# Altium schematic symbol library MYLIB.SchLib: 366 symbols (part 1 of 52)
Pins are listed as number, name and electrical type; pins without a type are passive.

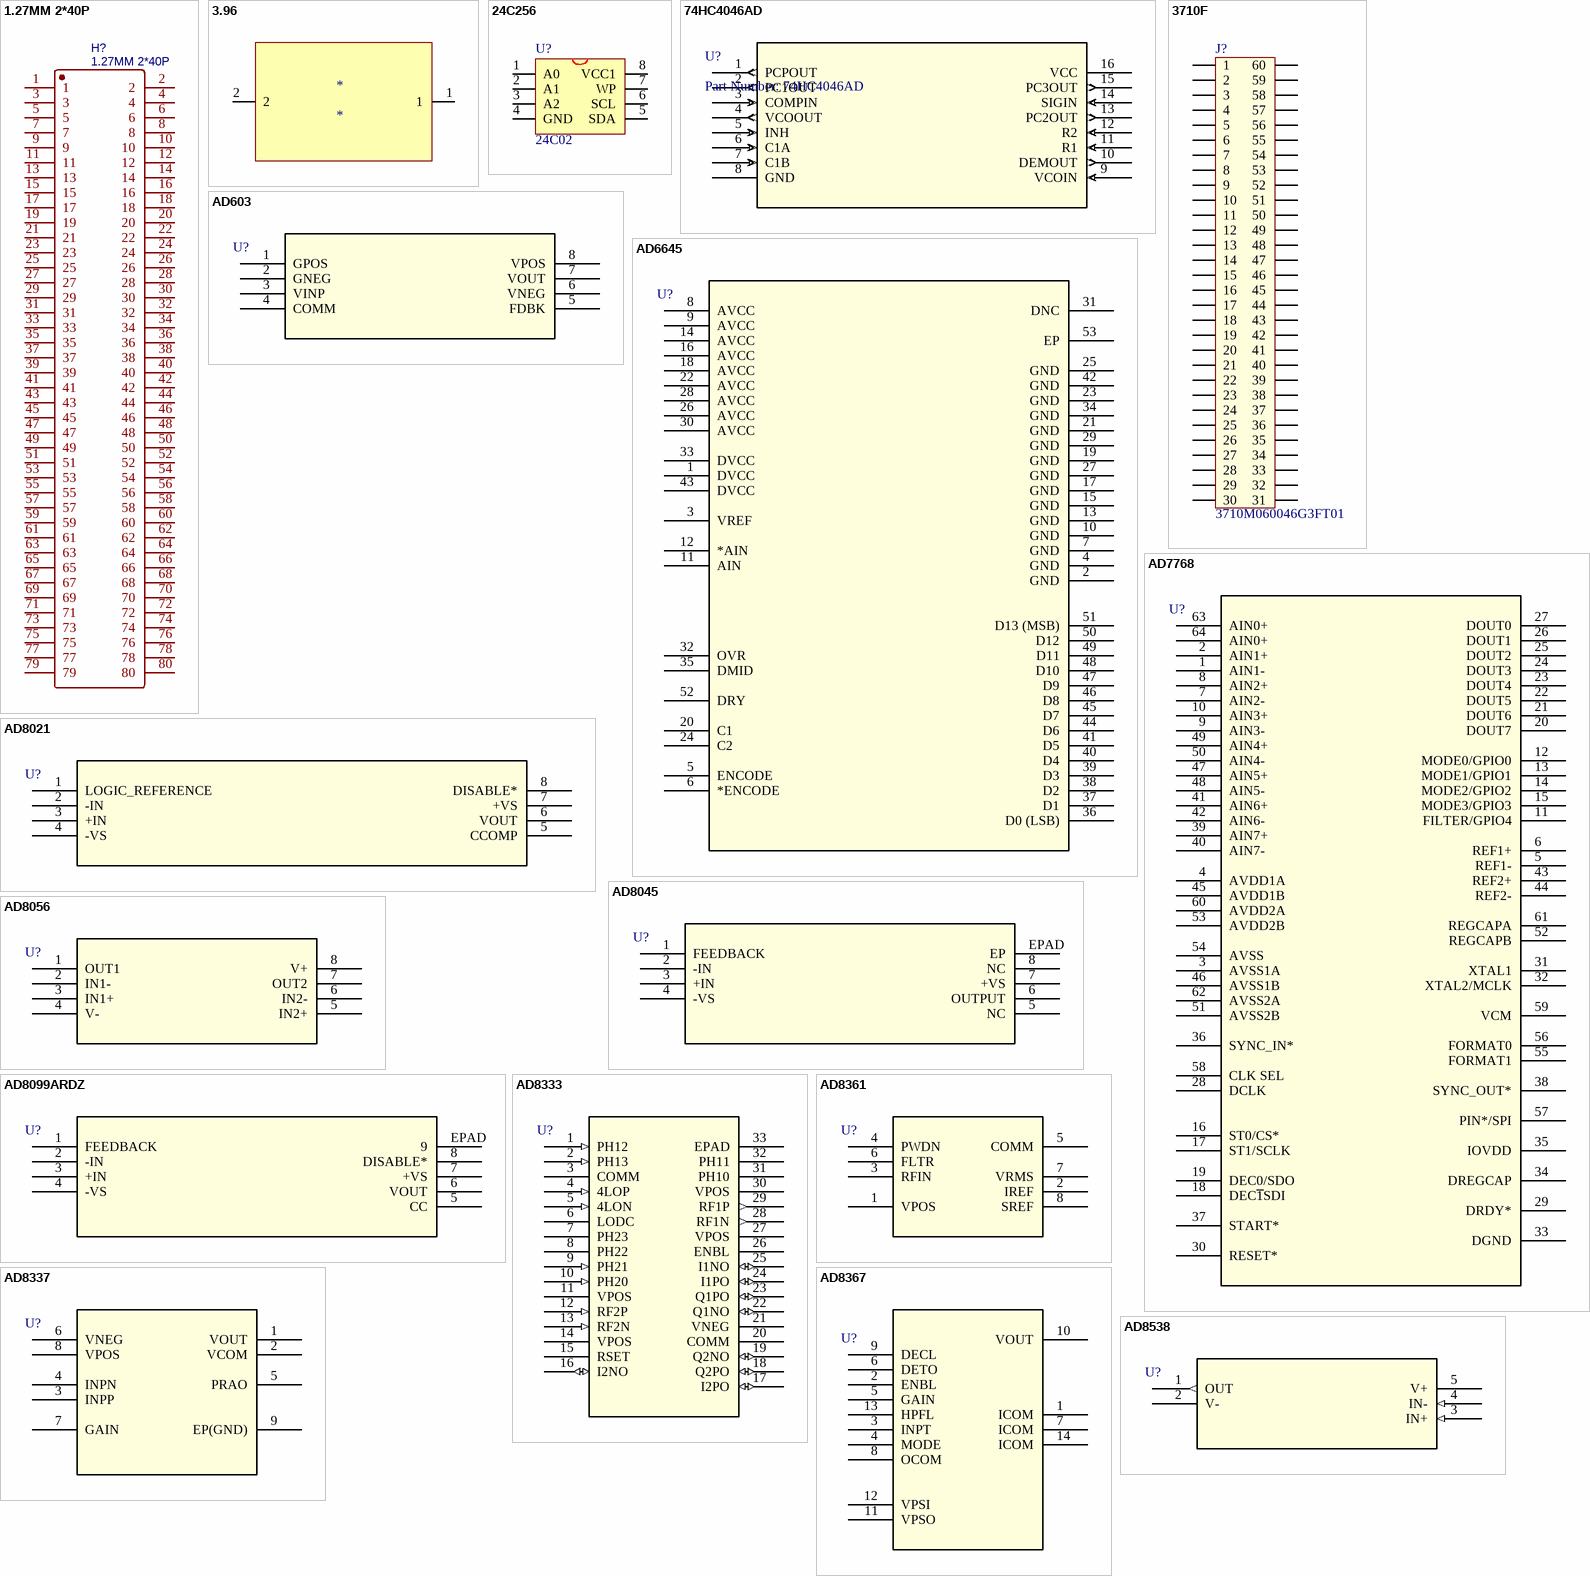
[diagram p0: symbols 1.27MM 2*40P to AD8538]

## 1.27MM 2*40P
designator H?
BOM_Manufacturer: BOOMELE; Contributor: LCSC; BOM_Supplier: LCSC; BOM_Manufacturer Part: 1.27mm 2*40P; BOM_Supplier Part: C34334; spicePre: H
footprint SMD-2X40P-1.27MM
pins: 1, 2, 3, 4, 5, 6, 7, 8, 9, 10, 11, 12, 13, 14, 15, 16, 17, 18, 19, 20, 21, 22, 23, 24, 25, 26, 27, 28, 29, 30, 31, 32, 33, 34, 35, 36, 37, 38, 39, 40, 41, 42, 43, 44, 45, 46, 47, 48, 49, 50, 51, 52, 53, 54, 55, 56, 57, 58, 59, 60, 61, 62, 63, 64, 65, 66, 67, 68, 69, 70, 71, 72, 73, 74, 75, 76, 77, 78, 79, 80

## 3.96
designator *
footprint 3.96
pins: 1, 2

## 24C256
designator U?, comment 24C02
EEPROM
footprint SOP-8 (SSOP8)
footprint TSSOP8 (Shrink Small Outline, MSOP; 8 Leads; Body Width 3 mm; Pitch 0.65 mm)
pins: 1 A0, 2 A1, 3 A2, 4 GND, 5 SDA, 6 SCL, 7 WP, 8 VCC1

## 74HC4046AD
designator U?, comment Part Number: 74HC4046AD
锁相环; Vendor: Nexperia; Manufacturer_Part_Number: 74HC4046AD; Copyright: Copyright (C) 2016 Accelerated Designs. All rights reserved; RefDes: RefDes; Type: DEV; Value: Value
footprint SOT109-1
footprint SOT109-1-M
footprint SOT109-1-L
pins: 1 PCPOUT (out), 2 PC1OUT (out), 3 COMPIN (in), 4 VCOOUT (out), 5 INH (in), 6 C1A (in), 7 C1B (in), 8 GND (power), 9 VCOIN (in), 10 DEMOUT (out), 11 R1 (in), 12 R2 (in), 13 PC2OUT (out), 14 SIGIN (in), 15 PC3OUT (out), 16 VCC (power)

## 3710F
designator J?, comment 3710M060046G3FT01
3710F060046G3FT01
footprint 3710F060046G3FT01 (PIN:0.8mm;SOP;FEMALE)
pins: 1, 2, 3, 4, 5, 6, 7, 8, 9, 10, 11, 12, 13, 14, 15, 16, 17, 18, 19, 20, 21, 22, 23, 24, 25, 26, 27, 28, 29, 30, 31, 32, 33, 34, 35, 36, 37, 38, 39, 40, 41, 42, 43, 44, 45, 46, 47, 48, 49, 50, 51, 52, 53, 54, 55, 56, 57, 58, 59, 60

## AD603
designator U?
低噪声、90 MHz可变增益放大器; Manufacturer_Part_Number: AD603ARZ; Vendor: Analog Devices Inc; Built_By: EMA_UL_Team; Copyright: Copyright (C) 2018 Accelerated Designs. All rights reserved; RefDes: RefDes; Type: DEV; Value: Value
footprint R_8
footprint R_8-L
footprint R_8-M
pins: 1 GPOS, 2 GNEG, 3 VINP, 4 COMM, 5 FDBK, 6 VNEG (power), 7 VOUT, 8 VPOS (power)

## AD6645
designator U?
14位、80 MSPS / 105 MSPS模数转换器; Copyright: Copyright (C) 2018 Accelerated Designs. All rights reserved; RefDes: RefDes; Type: DEV; Value: Value
footprint SV_52_1
pins: 1 DVCC, 2 GND, 3 VREF, 4 GND, 5 ENCODE, 6 *ENCODE, 7 GND, 8 AVCC, 9 AVCC, 10 GND, 11 AIN, 12 *AIN, 13 GND, 14 AVCC, 15 GND, 16 AVCC, 17 GND, 18 AVCC, 19 GND, 20 C1, 21 GND, 22 AVCC, 23 GND, 24 C2, 25 GND, 26 AVCC, 27 GND, 28 AVCC, 29 GND, 30 AVCC, 31 DNC, 32 OVR, 33 DVCC, 34 GND, 35 DMID, 36 D0 (LSB), 37 D1, 38 D2, 39 D3, 40 D4, 41 D5, 42 GND, 43 DVCC, 44 D6, 45 D7, 46 D8, 47 D9, 48 D10, 49 D11, 50 D12, 51 D13 (MSB), 52 DRY, 53 EP

## AD7768
designator U?
8通道、24位同步采样ADC; Manufacturer_Part_Number: AD7768BSTZ; Vendor: Analog Devices Inc; Built_By: EMA_UL_Team; Copyright: Copyright (C) 2018 Accelerated Designs. All rights reserved; RefDes: RefDes; Type: DEV; Value: Value
footprint ST_64_2
pins: 1 AIN1-, 2 AIN1+, 3 AVSS1A, 4 AVDD1A, 5 REF1-, 6 REF1+, 7 AIN2-, 8 AIN2+, 9 AIN3-, 10 AIN3+, 11 FILTER/GPIO4, 12 MODE0/GPIO0, 13 MODE1/GPIO1, 14 MODE2/GPIO2, 15 MODE3/GPIO3, 16 ST0/CS*, 17 ST1/SCLK, 18 DEC~{1}SDI, 19 DEC0/SDO, 20 DOUT7, 21 DOUT6, 22 DOUT5, 23 DOUT4, 24 DOUT3, 25 DOUT2, 26 DOUT1, 27 DOUT0, 28 DCLK, 29 DRDY*, 30 RESET*, 31 XTAL1, 32 XTAL2/MCLK, 33 DGND, 34 DREGCAP, 35 IOVDD, 36 SYNC_IN*, 37 START*, 38 SYNC_OUT*, 39 AIN7+, 40 AIN7-, 41 AIN6+, 42 AIN6-, 43 REF2+, 44 REF2-, 45 AVDD1B, 46 AVSS1B, 47 AIN5+, 48 AIN5-, 49 AIN4+, 50 AIN4-, 51 AVSS2B, 52 REGCAPB, 53 AVDD2B, 54 AVSS, 55 FORMAT1, 56 FORMAT0, 57 PIN*/SPI, 58 CLK SEL, 59 VCM, 60 AVDD2A, 61 REGCAPA, 62 AVSS2A, 63 AIN0+, 64 AIN0+

## AD8021
designator U?
低噪声、高速放大器，用于16 Bit系统; Manufacturer_Part_Number: AD8021ARZ; Vendor: Analog Devices Inc; Built_By: EMA_UL_Team; Copyright: Copyright (C) 2018 Accelerated Designs. All rights reserved; RefDes: RefDes; Type: DEV; Value: Value
footprint R_8
footprint R_8-L
footprint R_8-M
pins: 1 LOGIC_REFERENCE, 2 -IN, 3 +IN, 4 -VS (power), 5 CCOMP, 6 VOUT, 7 +VS (power), 8 DISABLE*

## AD8045
designator U?
3 nV/√Hz超低失真、电压反馈型、高速放大器; Manufacturer_Part_Number: AD8045ARDZ-REEL7; Vendor: Analog Devices Inc; Built_By: EMA_UL_Team; Copyright: Copyright (C) 2018 Accelerated Designs. All rights reserved; RefDes: RefDes; Type: DEV; Value: Value
footprint RD_8_1
footprint RD_8_1-L
footprint RD_8_1-M
pins: 1 FEEDBACK, 2 -IN, 3 +IN, 4 -VS (power), 5 NC, 6 OUTPUT, 7 +VS (power), 8 NC, EPAD EP

## AD8056
designator U?
双路、低成本、300 MHz电压反馈型放大器; Manufacturer_Part_Number: AD8671ARZ; Vendor: Analog Devices Inc; Built_By: EMA_UL_Team; Copyright: Copyright (C) 2018 Accelerated Designs. All rights reserved; RefDes: RefDes; Type: DEV; Value: Value
footprint R_8
footprint R_8-L
footprint R_8-M
pins: 1 OUT1, 2 IN1-, 3 IN1+, 4 V- (power), 5 IN2+, 6 IN2-, 7 OUT2 (power), 8 V+

## AD8099ARDZ
designator U?
超低失真、高速、0.95NV/√HZ电压噪声运算放大器; Manufacturer_Part_Number: AD8099ARDZ; Vendor: Analog Devices Inc; Built_By: EMA_UL_Team; Copyright: Copyright (C) 2018 Accelerated Designs. All rights reserved; RefDes: RefDes; Type: DEV; Value: Value
footprint RD_8_1
footprint RD_8_1-L
footprint RD_8_1-M
pins: 1 FEEDBACK, 2 -IN, 3 +IN, 4 -VS (power), 5 CC, 6 VOUT, 7 +VS (power), 8 DISABLE*, EPAD 9

## AD8333
designator U?
DC至50 MHz、双通道I/Q解调器和移相器; Manufacturer_Part_Number: AD8333ACPZ-WP; Vendor: Analog Devices Inc; Built_By: EMA_Jessica; Copyright: Copyright (C) 2018 Accelerated Designs. All rights reserved; RefDes: RefDes; Type: DEV; Value: Value
footprint CP_32_7
footprint CP_32_7-L
footprint CP_32_7-M
pins: 1 PH12 (in), 2 PH13 (in), 3 COMM, 4 4LOP (in), 5 4LON (in), 6 LODC, 7 PH23, 8 PH22, 9 PH21 (in), 10 PH20 (in), 11 VPOS (power), 12 RF2P (in), 13 RF2N (in), 14 VPOS (power), 15 RSET, 16 I2NO (io), 17 I2PO (io), 18 Q2PO (io), 19 Q2NO (io), 20 COMM, 21 VNEG (power), 22 Q1NO (io), 23 Q1PO (io), 24 I1PO (io), 25 I1NO (io), 26 ENBL, 27 VPOS (power), 28 RF1N (out), 29 RF1P (out), 30 VPOS (power), 31 PH10, 32 PH11, 33 EPAD

## AD8337
designator U?
通用型低成本直流耦合VGA; Copyright: Copyright (C) 2018 Accelerated Designs. All rights reserved; RefDes: RefDes; Type: DEV; Value: Value
footprint CP_8_13
pins: 1 VOUT, 2 VCOM, 3 INPP, 4 INPN, 5 PRAO, 6 VNEG, 7 GAIN, 8 VPOS, 9 EP(GND)

## AD8361
designator U?
LF至2.5 GHz TruPwr™检波器; Manufacturer_Part_Number: AD8361ARMZ; Vendor: Analog Devices Inc; Built_By: Analog_Devices_Team; Copyright: Copyright (C) 2018 Accelerated Designs. All rights reserved; RefDes: RefDes; Type: DEV; Value: Value
footprint RM_8
pins: 1 VPOS (power), 2 IREF (power), 3 RFIN, 4 PWDN, 5 COMM, 6 FLTR, 7 VRMS, 8 SREF

## AD8367
designator U?
500 MHz 、45dB线性dB可变增益放大器; Manufacturer_Part_Number: AD8367ARUZ; Built_By: EMA_UL_Team; Vendor: Analog Devices Inc; Copyright: Copyright (C) 2018 Accelerated Designs. All rights reserved; RefDes: RefDes; Type: DEV; Value: Value
footprint RU_14
pins: 1 ICOM, 2 ENBL, 3 INPT, 4 MODE, 5 GAIN, 6 DETO, 7 ICOM, 8 OCOM, 9 DECL, 10 VOUT, 11 VPSO (power), 12 VPSI (power), 13 HPFL, 14 ICOM

## AD8538
designator U?
低功耗、精密、自稳零运算放大器（采用5引脚TSOT-23封装）; Manufacturer_Part_Number: AD8538AUJZ-REEL7; Vendor: Analog Devices Inc; Built_By: EMA_UL_Team; Copyright: Copyright (C) 2018 Accelerated Designs. All rights reserved; RefDes: RefDes; Type: DEV; Value: Value
footprint UJ_5
pins: 1 OUT (out), 2 V- (power), 3 IN+ (in), 4 IN- (in), 5 V+ (power)

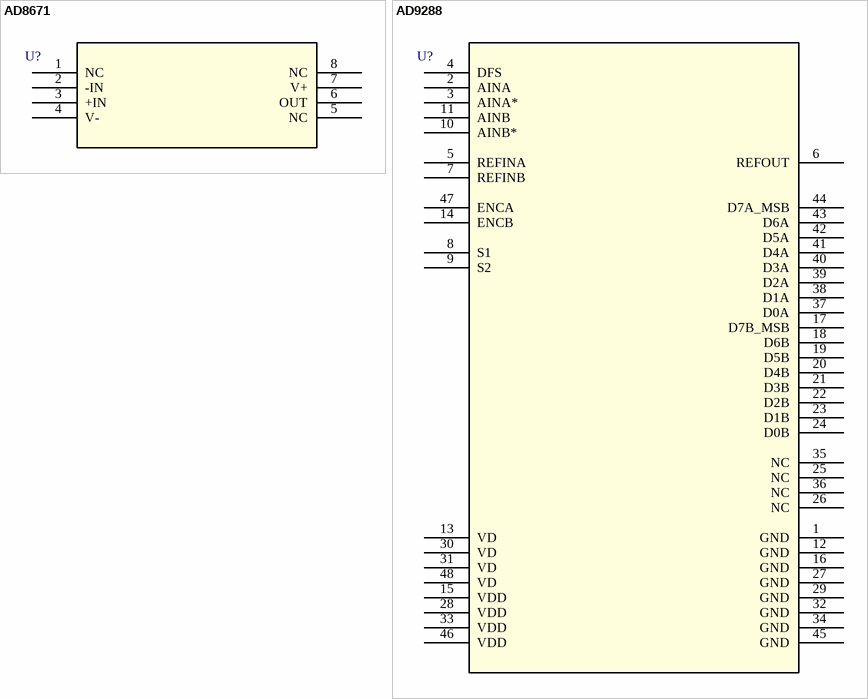
[diagram p1: symbols AD8671 to AD9288]

## AD8671
designator U?
精密、低噪声、低输入偏置电流、单通道运算放大器; Manufacturer_Part_Number: AD8671ARZ; Vendor: Analog Devices Inc; Built_By: EMA_UL_Team; Copyright: Copyright (C) 2018 Accelerated Designs. All rights reserved; RefDes: RefDes; Type: DEV; Value: Value
footprint R_8
footprint R_8-L
footprint R_8-M
pins: 1 NC, 2 -IN, 3 +IN, 4 V- (power), 5 NC, 6 OUT, 7 V+ (power), 8 NC

## AD9288
designator U?
8位、40/80/100 MSPS、双核ADC; Manufacturer_Part_Number: AD9288BSTZ-100; Vendor: Vendor; Copyright: Copyright (C) 2018 Accelerated Designs. All rights reserved; RefDes: RefDes; Type: DEV; Value: Value
footprint ST_48
pins: 1 GND, 2 AINA, 3 AINA*, 4 DFS, 5 REFINA, 6 REFOUT, 7 REFINB, 8 S1, 9 S2, 10 AINB*, 11 AINB, 12 GND, 13 VD (power), 14 ENCB, 15 VDD (power), 16 GND, 17 D7B_MSB, 18 D6B, 19 D5B, 20 D4B, 21 D3B, 22 D2B, 23 D1B, 24 D0B, 25 NC, 26 NC, 27 GND, 28 VDD (power), 29 GND, 30 VD (power), 31 VD (power), 32 GND, 33 VDD (power), 34 GND, 35 NC, 36 NC, 37 D0A, 38 D1A, 39 D2A, 40 D3A, 41 D4A, 42 D5A, 43 D6A, 44 D7A_MSB, 45 GND, 46 VDD (power), 47 ENCA, 48 VD (power)

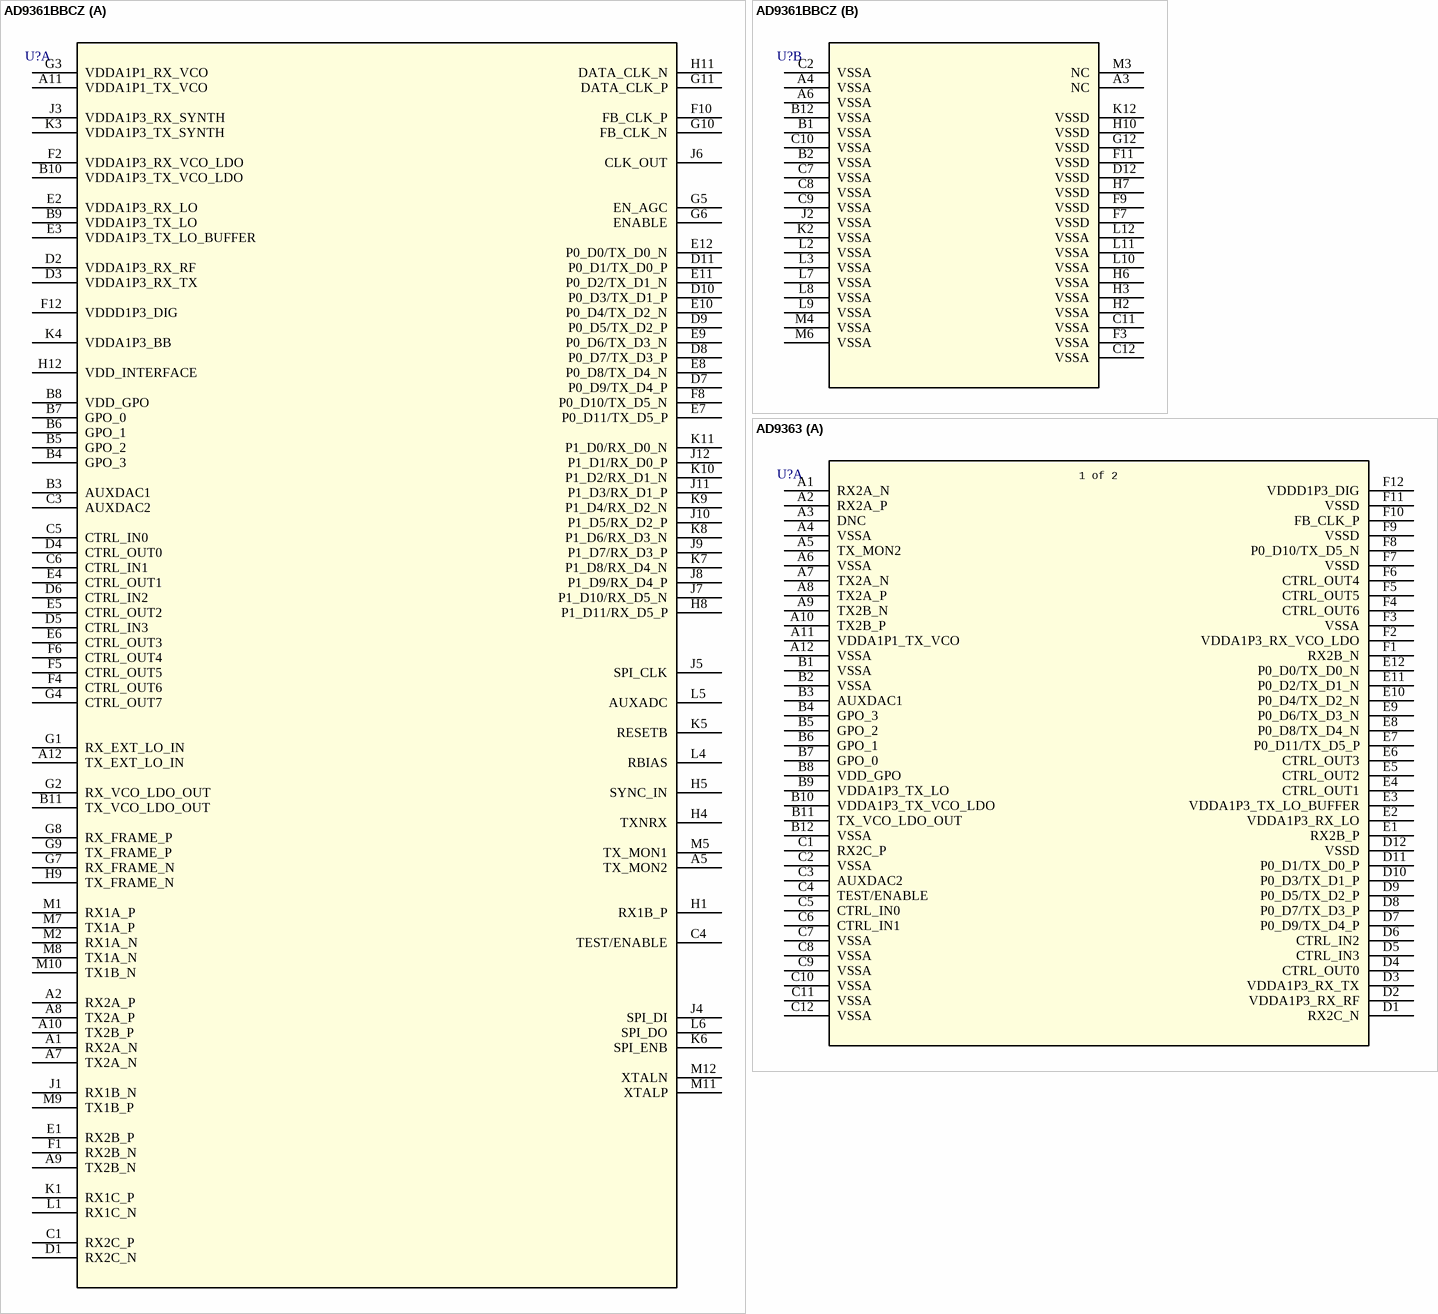
[diagram p2: symbols AD9361BBCZ to AD9363]

## AD9361BBCZ
designator U?
2 X 2 RF捷变收发器; Manufacturer_Part_Number: AD9361BBCZ; Vendor: Analog Devices Inc; Built_By: EMA_UL_Team; Copyright: Copyright (C) 2018 Accelerated Designs. All rights reserved; RefDes: RefDes; Type: DEV; Value: Value
footprint BC_144_7
part A pins: A1 RX2A_N, A2 RX2A_P, A5 TX_MON2, A7 TX2A_N, A8 TX2A_P, A9 TX2B_N, A10 TX2B_P, A11 VDDA1P1_TX_VCO, A12 TX_EXT_LO_IN, B3 AUXDAC1, B4 GPO_3, B5 GPO_2, B6 GPO_1, B7 GPO_0, B8 VDD_GPO, B9 VDDA1P3_TX_LO, B10 VDDA1P3_TX_VCO_LDO, B11 TX_VCO_LDO_OUT, C1 RX2C_P, C3 AUXDAC2, C4 TEST/ENABLE, C5 CTRL_IN0, C6 CTRL_IN1, D1 RX2C_N, D2 VDDA1P3_RX_RF, D3 VDDA1P3_RX_TX, D4 CTRL_OUT0, D5 CTRL_IN3, D6 CTRL_IN2, D7 P0_D9/TX_D4_P, D8 P0_D7/TX_D3_P, D9 P0_D5/TX_D2_P, D10 P0_D3/TX_D1_P, D11 P0_D1/TX_D0_P, E1 RX2B_P, E2 VDDA1P3_RX_LO, E3 VDDA1P3_TX_LO_BUFFER, E4 CTRL_OUT1, E5 CTRL_OUT2, E6 CTRL_OUT3, E7 P0_D11/TX_D5_P, E8 P0_D8/TX_D4_N, E9 P0_D6/TX_D3_N, E10 P0_D4/TX_D2_N, E11 P0_D2/TX_D1_N, E12 P0_D0/TX_D0_N, F1 RX2B_N, F2 VDDA1P3_RX_VCO_LDO, F4 CTRL_OUT6, F5 CTRL_OUT5, F6 CTRL_OUT4, F8 P0_D10/TX_D5_N, F10 FB_CLK_P, F12 VDDD1P3_DIG, G1 RX_EXT_LO_IN, G2 RX_VCO_LDO_OUT, G3 VDDA1P1_RX_VCO, G4 CTRL_OUT7, G5 EN_AGC, G6 ENABLE, G7 RX_FRAME_N, G8 RX_FRAME_P, G9 TX_FRAME_P, G10 FB_CLK_N, G11 DATA_CLK_P, H1 RX1B_P, H4 TXNRX, H5 SYNC_IN, H8 P1_D11/RX_D5_P, H9 TX_FRAME_N, H11 DATA_CLK_N, H12 VDD_INTERFACE, J1 RX1B_N, J3 VDDA1P3_RX_SYNTH, J4 SPI_DI, J5 SPI_CLK, J6 CLK_OUT, J7 P1_D10/RX_D5_N, J8 P1_D9/RX_D4_P, J9 P1_D7/RX_D3_P, J10 P1_D5/RX_D2_P, J11 P1_D3/RX_D1_P, J12 P1_D1/RX_D0_P, K1 RX1C_P, K3 VDDA1P3_TX_SYNTH, K4 VDDA1P3_BB, K5 RESETB, K6 SPI_ENB, K7 P1_D8/RX_D4_N, K8 P1_D6/RX_D3_N, K9 P1_D4/RX_D2_N, K10 P1_D2/RX_D1_N, K11 P1_D0/RX_D0_N, L1 RX1C_N, L4 RBIAS, L5 AUXADC, L6 SPI_DO, M1 RX1A_P, M2 RX1A_N, M5 TX_MON1, M7 TX1A_P, M8 TX1A_N, M9 TX1B_P, M10 TX1B_N, M11 XTALP, M12 XTALN
part B pins: A3 NC, A4 VSSA, A6 VSSA, B1 VSSA, B2 VSSA, B12 VSSA, C2 VSSA, C7 VSSA, C8 VSSA, C9 VSSA, C10 VSSA, C11 VSSA, C12 VSSA, D12 VSSD, F3 VSSA, F7 VSSD, F9 VSSD, F11 VSSD, G12 VSSD, H2 VSSA, H3 VSSA, H6 VSSA, H7 VSSD, H10 VSSD, J2 VSSA, K2 VSSA, K12 VSSD, L2 VSSA, L3 VSSA, L7 VSSA, L8 VSSA, L9 VSSA, L10 VSSA, L11 VSSA, L12 VSSA, M3 NC, M4 VSSA, M6 VSSA

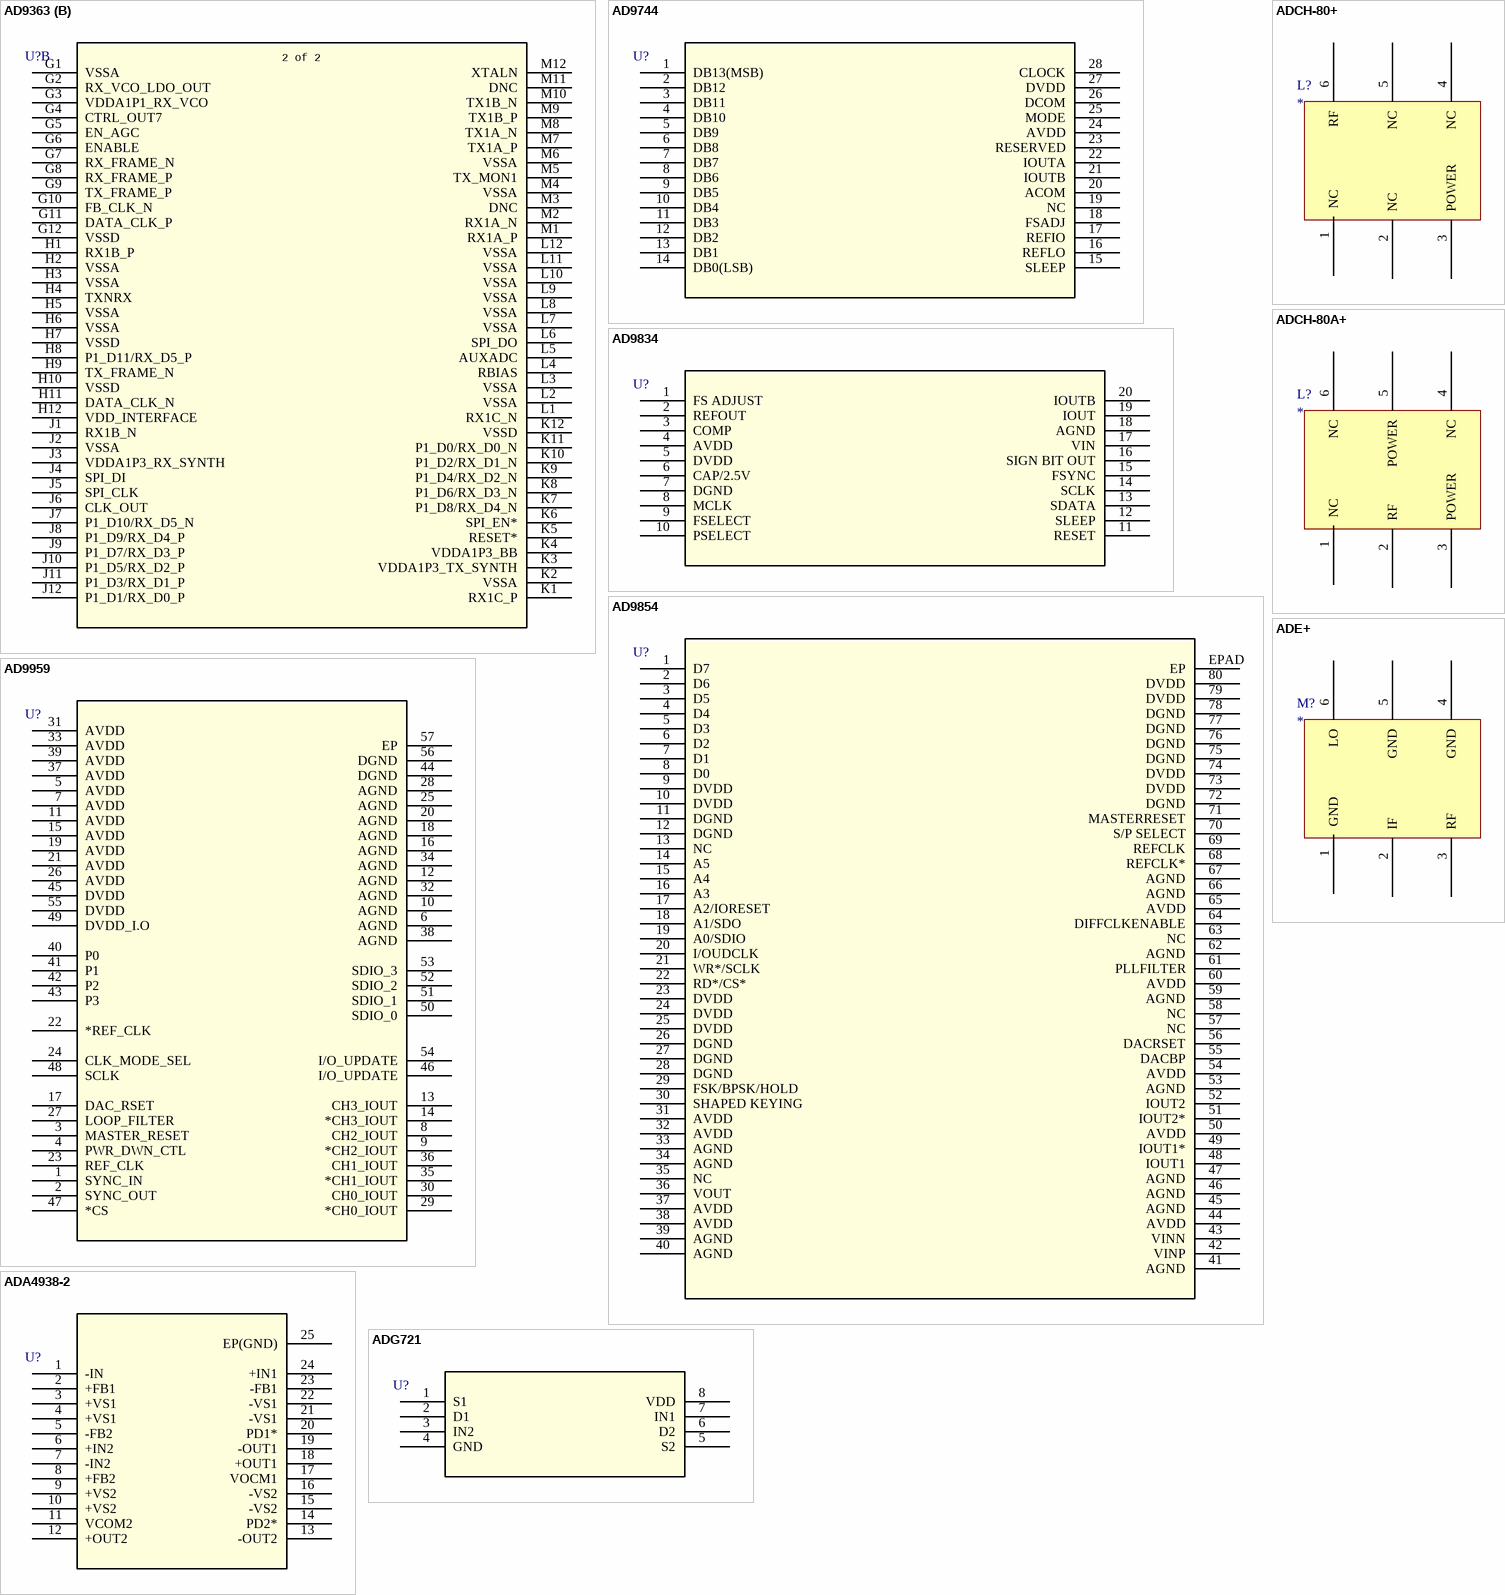
[diagram p3: symbols AD9363 to ADG721]

## AD9363
designator U?
RF捷变收发器; Manufacturer_Part_Number: AD9363ABCZ; Vendor: Analog Devices Inc; Built_By: Analog Devices Inc.; Copyright: Copyright (C) 2018 Accelerated Designs. All rights reserved; RefDes: RefDes; Type: DEV; Value: Value
footprint BC_144_7
part A pins: A1 RX2A_N, A2 RX2A_P, A3 DNC, A4 VSSA, A5 TX_MON2, A6 VSSA, A7 TX2A_N, A8 TX2A_P, A9 TX2B_N, A10 TX2B_P, A11 VDDA1P1_TX_VCO, A12 VSSA, B1 VSSA, B2 VSSA, B3 AUXDAC1, B4 GPO_3, B5 GPO_2, B6 GPO_1, B7 GPO_0, B8 VDD_GPO, B9 VDDA1P3_TX_LO, B10 VDDA1P3_TX_VCO_LDO, B11 TX_VCO_LDO_OUT, B12 VSSA, C1 RX2C_P, C2 VSSA, C3 AUXDAC2, C4 TEST/ENABLE, C5 CTRL_IN0, C6 CTRL_IN1, C7 VSSA, C8 VSSA, C9 VSSA, C10 VSSA, C11 VSSA, C12 VSSA, D1 RX2C_N, D2 VDDA1P3_RX_RF, D3 VDDA1P3_RX_TX, D4 CTRL_OUT0, D5 CTRL_IN3, D6 CTRL_IN2, D7 P0_D9/TX_D4_P, D8 P0_D7/TX_D3_P, D9 P0_D5/TX_D2_P, D10 P0_D3/TX_D1_P, D11 P0_D1/TX_D0_P, D12 VSSD, E1 RX2B_P, E2 VDDA1P3_RX_LO, E3 VDDA1P3_TX_LO_BUFFER, E4 CTRL_OUT1, E5 CTRL_OUT2, E6 CTRL_OUT3, E7 P0_D11/TX_D5_P, E8 P0_D8/TX_D4_N, E9 P0_D6/TX_D3_N, E10 P0_D4/TX_D2_N, E11 P0_D2/TX_D1_N, E12 P0_D0/TX_D0_N, F1 RX2B_N, F2 VDDA1P3_RX_VCO_LDO, F3 VSSA, F4 CTRL_OUT6, F5 CTRL_OUT5, F6 CTRL_OUT4, F7 VSSD, F8 P0_D10/TX_D5_N, F9 VSSD, F10 FB_CLK_P, F11 VSSD, F12 VDDD1P3_DIG
part B pins: G1 VSSA, G2 RX_VCO_LDO_OUT, G3 VDDA1P1_RX_VCO, G4 CTRL_OUT7, G5 EN_AGC, G6 ENABLE, G7 RX_FRAME_N, G8 RX_FRAME_P, G9 TX_FRAME_P, G10 FB_CLK_N, G11 DATA_CLK_P, G12 VSSD, H1 RX1B_P, H2 VSSA, H3 VSSA, H4 TXNRX, H5 VSSA, H6 VSSA, H7 VSSD, H8 P1_D11/RX_D5_P, H9 TX_FRAME_N, H10 VSSD, H11 DATA_CLK_N, H12 VDD_INTERFACE, J1 RX1B_N, J2 VSSA, J3 VDDA1P3_RX_SYNTH, J4 SPI_DI, J5 SPI_CLK, J6 CLK_OUT, J7 P1_D10/RX_D5_N, J8 P1_D9/RX_D4_P, J9 P1_D7/RX_D3_P, J10 P1_D5/RX_D2_P, J11 P1_D3/RX_D1_P, J12 P1_D1/RX_D0_P, K1 RX1C_P, K2 VSSA, K3 VDDA1P3_TX_SYNTH, K4 VDDA1P3_BB, K5 RESET*, K6 SPI_EN*, K7 P1_D8/RX_D4_N, K8 P1_D6/RX_D3_N, K9 P1_D4/RX_D2_N, K10 P1_D2/RX_D1_N, K11 P1_D0/RX_D0_N, K12 VSSD, L1 RX1C_N, L2 VSSA, L3 VSSA, L4 RBIAS, L5 AUXADC, L6 SPI_DO, L7 VSSA, L8 VSSA, L9 VSSA, L10 VSSA, L11 VSSA, L12 VSSA, M1 RX1A_P, M2 RX1A_N, M3 DNC, M4 VSSA, M5 TX_MON1, M6 VSSA, M7 TX1A_P, M8 TX1A_N, M9 TX1B_P, M10 TX1B_N, M11 DNC, M12 XTALN
part A text: 1 of 2
part B text: 2 of 2

## AD9744
designator U?
14位、210 MSPS TxDAC®数模转换器; Manufacturer_Part_Number: AD9744ARUZ; Vendor: Analog Devices Inc; Built_By: EMA_UL_Team; Copyright: Copyright (C) 2018 Accelerated Designs. All rights reserved; RefDes: RefDes; Type: DEV; Value: Value
footprint RU_28
pins: 1 DB13(MSB), 2 DB12, 3 DB11, 4 DB10, 5 DB9, 6 DB8, 7 DB7, 8 DB6, 9 DB5, 10 DB4, 11 DB3, 12 DB2, 13 DB1, 14 DB0(LSB), 15 SLEEP, 16 REFLO, 17 REFIO, 18 FSADJ, 19 NC, 20 ACOM, 21 IOUTB, 22 IOUTA, 23 RESERVED, 24 AVDD (power), 25 MODE, 26 DCOM, 27 DVDD (power), 28 CLOCK

## AD9834
designator U?
20 mW功耗、2.3 V至5.5 V、75 MHz完整DDS; Manufacturer_Part_Number: AD9834CRUZ; Vendor: Analog Devices Inc; Built_By: EMA_UL_Team; Copyright: Copyright (C) 2018 Accelerated Designs. All rights reserved; RefDes: RefDes; Type: DEV; Value: Value
footprint RU_20
pins: 1 FS ADJUST, 2 REFOUT, 3 COMP, 4 AVDD (power), 5 DVDD (power), 6 CAP/2.5V, 7 DGND, 8 MCLK, 9 FSELECT, 10 PSELECT, 11 RESET, 12 SLEEP, 13 SDATA, 14 SCLK, 15 FSYNC, 16 SIGN BIT OUT, 17 VIN, 18 AGND, 19 IOUT, 20 IOUTB

## AD9854
designator U?
CMOS 300 MSPS正交完整DDS; Manufacturer_Part_Number: AD9854ASVZ; Vendor: Analog Devices Inc; Built_By: EMA_UL_Team; Copyright: Copyright (C) 2018 Accelerated Designs. All rights reserved; RefDes: RefDes; Type: DEV; Value: Value
footprint SV_80_4-L
pins: 1 D7, 2 D6, 3 D5, 4 D4, 5 D3, 6 D2, 7 D1, 8 D0, 9 DVDD (power), 10 DVDD (power), 11 DGND, 12 DGND, 13 NC, 14 A5, 15 A4, 16 A3, 17 A2/IORESET, 18 A1/SDO, 19 A0/SDIO, 20 I/OUDCLK, 21 WR*/SCLK, 22 RD*/CS*, 23 DVDD (power), 24 DVDD (power), 25 DVDD (power), 26 DGND, 27 DGND, 28 DGND, 29 FSK/BPSK/HOLD, 30 SHAPED KEYING, 31 AVDD (power), 32 AVDD (power), 33 AGND, 34 AGND, 35 NC, 36 VOUT, 37 AVDD (power), 38 AVDD (power), 39 AGND, 40 AGND, 41 AGND, 42 VINP, 43 VINN, 44 AVDD (power), 45 AGND, 46 AGND, 47 AGND, 48 IOUT1, 49 IOUT1*, 50 AVDD (power), 51 IOUT2*, 52 IOUT2, 53 AGND, 54 AVDD (power), 55 DACBP, 56 DACRSET, 57 NC, 58 NC, 59 AGND, 60 AVDD (power), 61 PLLFILTER, 62 AGND, 63 NC, 64 DIFFCLKENABLE, 65 AVDD (power), 66 AGND, 67 AGND, 68 REFCLK*, 69 REFCLK, 70 S/P SELECT, 71 MASTERRESET, 72 DGND, 73 DVDD (power), 74 DVDD (power), 75 DGND, 76 DGND, 77 DGND, 78 DGND, 79 DVDD (power), 80 DVDD (power), EPAD EP

## AD9959
designator U?
内置四通道10 bit DAC的500 MSPS直接数字频率合成器; Manufacturer_Part_Number: AD9959BCPZ; Vendor: Analog Devices Inc; Built_By: EMA_UL_Team; Copyright: Copyright (C) 2018 Accelerated Designs. All rights reserved; RefDes: RefDes; Type: DEV; Value: Value
footprint CP_56_1
footprint CP_56_1-L
footprint CP_56_1-M
pins: 1 SYNC_IN, 2 SYNC_OUT, 3 MASTER_RESET, 4 PWR_DWN_CTL, 5 AVDD, 6 AGND, 7 AVDD, 8 CH2_IOUT, 9 *CH2_IOUT, 10 AGND, 11 AVDD, 12 AGND, 13 CH3_IOUT, 14 *CH3_IOUT, 15 AVDD, 16 AGND, 17 DAC_RSET, 18 AGND, 19 AVDD, 20 AGND, 21 AVDD, 22 *REF_CLK, 23 REF_CLK, 24 CLK_MODE_SEL, 25 AGND, 26 AVDD, 27 LOOP_FILTER, 28 AGND, 29 *CH0_IOUT, 30 CH0_IOUT, 31 AVDD, 32 AGND, 33 AVDD, 34 AGND, 35 *CH1_IOUT, 36 CH1_IOUT, 37 AVDD, 38 AGND, 39 AVDD, 40 P0, 41 P1, 42 P2, 43 P3, 44 DGND, 45 DVDD, 46 I/O_UPDATE, 47 *CS, 48 SCLK, 49 DVDD_I.O, 50 SDIO_0, 51 SDIO_1, 52 SDIO_2, 53 SDIO_3, 54 I/O_UPDATE, 55 DVDD, 56 DGND, 57 EP